# Altium footprint library ACTION_排针排座.PcbLib: 121 footprints (part 1 of 8)
Each footprint in its own frame and in the unit in brackets; x right, y up, seen from the top. Pads: shape width x height; smd on the part's side, far side on the other; paste and mask are expansions set on the pad; w line width, h text height; cw(c..) or ccw(c..) is an arc to the next point about the centre after c.
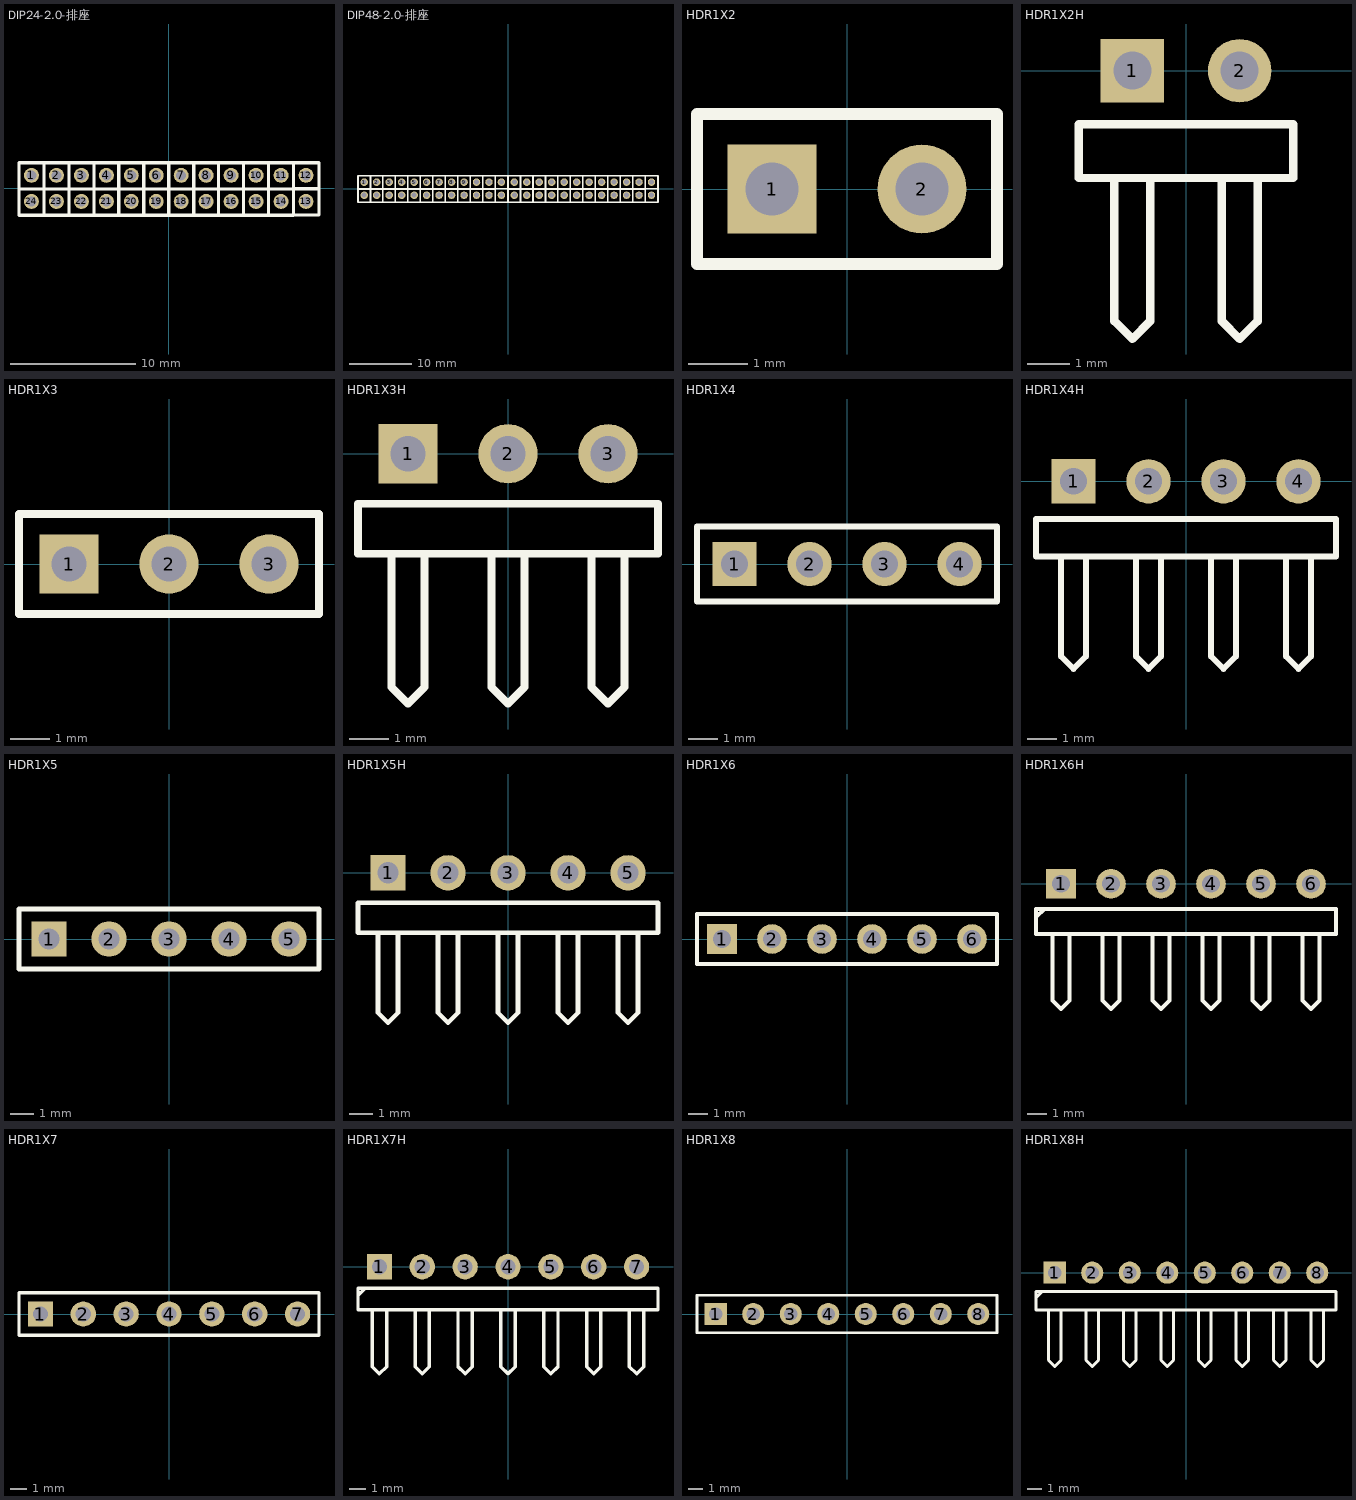
[diagram p0: the footprints below, top view; thin cyan lines are the x and y axes]

## DIP24-2.0-排座 [mm]
pads (24):
  round 1.2 hole 0.8: 1(-11,1.05) 2(-9,1.05) 3(-7,1.05) 4(-5,1.05) 5(-3,1.05) 6(-1,1.05) 7(1,1.05) 8(3,1.05) 9(5,1.05) 10(7,1.05) 11(9,1.05) 12(11,1.05) 13(11,-1.05) 14(9,-1.05) 15(7,-1.05) 16(5,-1.05) 17(3,-1.05) 18(1,-1.05) 19(-1,-1.05) 20(-3,-1.05) 21(-5,-1.05) 22(-7,-1.05) 23(-9,-1.05) 24(-11,-1.05)
Top Overlay:
  lines w0.254: -10.12,2.05 12.042,2.05 12.042,-2.142 9.96,-2.142 ; -10,-2.05 -10,-0.05 ; -10,0.05 -10,2.05 ; -8,-2.05 -8,-0.05 ; -8,0.05 -8,2.05 ; -6,-2.05 -6,-0.05 ; -6,0.05 -6,2.05 ; -4,-2.05 -4,-0.05 ; -4,0.05 -4,2.05 ; -2,-2.05 -2,-0.05 ; -2,0.05 -2,2.05 ; 0,-2.05 0,-0.05 ; 0,0.05 0,2.05 ; 2,-2.05 2,-0.05 ; 2,0.05 2,2.05 ; 4,-2.05 4,-0.05 ; 4,0.05 4,2.05 ; 6,-2.05 6,-0.05 ; 6,0.05 6,2.05 ; 8,-2.05 8,-0.05 ; 8,0.05 8,2.05 ; 9.985,-0.034 11.966,-0.034 ; 10,-2.15 -12,-2.15 -12,-0.05 ; 10,-2.05 10,-0.05 ; 10.007,0.05 10.007,2.05 -12,2.05 -12,-0.05 ; -12,-0.05 10,-0.05 ; -12,-0.05 10,-0.05

## DIP48-2.0-排座 [mm]
pads (48):
  round 1.2 hole 0.8: 1(-23.063,1.092) 2(-21.063,1.092) 3(-19.063,1.092) 4(-17.063,1.092) 5(-15.063,1.092) 6(-13.063,1.092) 7(-11.063,1.092) 8(-9.063,1.092) 9(-7.063,1.092) 10(-5.063,1.092) 11(-3.063,1.092) 12(-1.063,1.092) 13(0.991,1.092) 14(2.991,1.092) 15(4.991,1.092) 16(6.991,1.092) 17(8.991,1.092) 18(10.991,1.092) 19(12.991,1.092) 20(14.991,1.092) 21(16.991,1.092) 22(18.991,1.092) 23(20.991,1.092) 24(22.991,1.092) 25(22.991,-1.008) 26(20.991,-1.008) 27(18.991,-1.008) 28(16.991,-1.008) 29(14.991,-1.008) 30(12.991,-1.008) 31(10.991,-1.008) 32(8.991,-1.008) 33(6.991,-1.008) 34(4.991,-1.008) 35(2.991,-1.008) 36(0.991,-1.008) 37(-1.063,-1.008) 38(-3.063,-1.008) 39(-5.063,-1.008) 40(-7.063,-1.008) 41(-9.063,-1.008) 42(-11.063,-1.008) 43(-13.063,-1.008) 44(-15.063,-1.008) 45(-17.063,-1.008) 46(-19.063,-1.008) 47(-21.063,-1.008) 48(-23.063,-1.008)
Top Overlay:
  lines w0.254: -22.184,2.092 -0.021,2.092 -0.021,-2.1 -2.104,-2.1 ; -22.063,-2.008 -22.063,-0.008 ; -22.063,0.092 -22.063,2.092 ; -20.063,-2.008 -20.063,-0.008 ; -20.063,0.092 -20.063,2.092 ; -18.063,-2.008 -18.063,-0.008 ; -18.063,0.092 -18.063,2.092 ; -16.063,-2.008 -16.063,-0.008 ; -16.063,0.092 -16.063,2.092 ; -14.063,-2.008 -14.063,-0.008 ; -14.063,0.092 -14.063,2.092 ; -12.063,-2.008 -12.063,-0.008 ; -12.063,0.092 -12.063,2.092 ; -10.063,-2.008 -10.063,-0.008 ; -10.063,0.092 -10.063,2.092 ; -8.063,-2.008 -8.063,-0.008 ; -8.063,0.092 -8.063,2.092 ; -6.063,-2.008 -6.063,-0.008 ; -6.063,0.092 -6.063,2.092 ; -4.063,-2.008 -4.063,-0.008 ; -4.063,0.092 -4.063,2.092 ; -2.078,0.008 -0.097,0.008 ; -2.063,-2.108 -24.063,-2.108 -24.063,-0.008 ; -2.063,-2.008 -2.063,-0.008 ; -2.057,0.092 -2.057,2.092 -24.063,2.092 -24.063,-0.008 ; 1.87,2.092 24.033,2.092 24.033,-2.1 21.95,-2.1 ; 1.991,-2.008 1.991,-0.008 ; 1.991,0.092 1.991,2.092 ; 3.991,-2.008 3.991,-0.008 ; 3.991,0.092 3.991,2.092 ; 5.991,-2.008 5.991,-0.008 ; 5.991,0.092 5.991,2.092 ; 7.991,-2.008 7.991,-0.008 ; 7.991,0.092 7.991,2.092 ; 9.991,-2.008 9.991,-0.008 ; 9.991,0.092 9.991,2.092 ; 11.991,-2.008 11.991,-0.008 ; 11.991,0.092 11.991,2.092 ; 13.991,-2.008 13.991,-0.008 ; 13.991,0.092 13.991,2.092 ; 15.991,-2.008 15.991,-0.008 ; 15.991,0.092 15.991,2.092 ; 17.991,-2.008 17.991,-0.008 ; 17.991,0.092 17.991,2.092 ; 19.991,-2.008 19.991,-0.008 ; 19.991,0.092 19.991,2.092 ; 21.976,0.008 23.957,0.008 ; 21.991,-2.108 -0.009,-2.108 -0.009,-0.008 ; 21.991,-2.008 21.991,-0.008 ; 21.997,0.092 21.997,2.092 -0.009,2.092 -0.009,-0.008 ; -24.063,-0.008 -2.063,-0.008 ; -24.063,-0.008 -2.063,-0.008 ; -0.009,-0.008 21.991,-0.008 ; -0.009,-0.008 21.991,-0.008

## HDR1X2 [mm] "Connector; Header; 2 Position"
pads (2):
  rect 1.5x1.5 hole 0.9: 1(-1.27,0)
  round 1.5 hole 0.9: 2(1.27,0)
Top Overlay:
  lines w0.2: -2.54,-1.27 2.54,-1.27 2.54,1.27 -2.54,1.27 -2.54,-1.27
3D body "HEADER 2.STEP": height 10.1, standoff -1.5, extent -2.515,-1.295 2.565,1.245

## HDR1X2H [mm] "Connector; Header; 2 Position; Right Angle"
pads (2):
  rect 1.5x1.5 hole 0.9: 1(-1.27,0)
  round 1.5 hole 0.9: 2(1.27,0)
Top Overlay:
  lines w0.2: -1.693,-2.54 -1.693,-5.927 -1.27,-6.35 -0.847,-5.927 -0.847,-2.54 ; 0.847,-2.54 0.847,-5.927 1.27,-6.35 1.693,-5.927 1.693,-2.54 ; -2.54,-2.54 2.54,-2.54 2.54,-1.27 -2.54,-1.27 -2.54,-2.54
3D body "HEADER 2H.STEP": height 4.33, standoff -3, extent -2.565,-7.051 2.515,1.219

## HDR1X3 [mm] "Connector; Header; 3 Position"
pads (3):
  rect 1.5x1.5 hole 0.9: 1(-2.54,0)
  round 1.5 hole 0.9: 2(0,0) 3(2.54,0)
Top Overlay:
  lines w0.2: -3.81,-1.27 3.81,-1.27 3.81,1.27 -3.81,1.27 -3.81,-1.27
3D body "HEADER 3.STEP": height 10.1, standoff -1.5, extent -3.835,-1.245 3.785,1.295

## HDR1X3H [mm] "Connector; Header; 3 Position; Right Angle"
pads (3):
  rect 1.5x1.5 hole 0.9: 1(-2.54,0)
  round 1.5 hole 0.9: 2(0,0) 3(2.54,0)
Top Overlay:
  lines w0.2: -2.963,-2.54 -2.963,-5.927 -2.54,-6.35 -2.117,-5.927 -2.117,-2.54 ; -0.423,-2.54 -0.423,-5.927 0,-6.35 0.423,-5.927 0.423,-2.54 ; 2.117,-2.54 2.117,-5.927 2.54,-6.35 2.963,-5.927 2.963,-2.54 ; -3.81,-2.54 -3.81,-1.27 3.81,-1.27 3.81,-2.54 -3.81,-2.54
3D body "HEADER 3H.STEP": height 4.27, standoff -3.05, extent -3.835,-7.102 3.785,1.168

## HDR1X4 [mm] "Connector; Header; 4 Position"
pads (4):
  rect 1.5x1.5 hole 0.9: 1(-3.81,0)
  round 1.5 hole 0.9: 2(-1.27,0) 3(1.27,0) 4(3.81,0)
Top Overlay:
  lines w0.2: -5.08,-1.27 -5.08,1.27 5.08,1.27 5.08,-1.27 -5.08,-1.27
3D body "HEADER 4.STEP": height 10.1, standoff -1.5, extent -5.08,-1.219 5.08,1.321

## HDR1X4H [mm] "Connector; Header; 4 Position; Right Angle"
pads (4):
  rect 1.5x1.5 hole 0.9: 1(-3.81,0)
  round 1.5 hole 0.9: 2(-1.27,0) 3(1.27,0) 4(3.81,0)
Top Overlay:
  lines w0.2: -4.233,-2.54 -4.233,-5.927 -3.81,-6.35 -3.387,-5.927 -3.387,-2.54 ; -1.693,-2.54 -1.693,-5.927 -1.27,-6.35 -0.847,-5.927 -0.847,-2.54 ; 0.847,-2.54 0.847,-5.927 1.27,-6.35 1.693,-5.927 1.693,-2.54 ; 3.387,-2.54 3.387,-5.927 3.81,-6.35 4.233,-5.927 4.233,-2.54 ; -5.08,-2.54 5.08,-2.54 5.08,-1.27 -5.08,-1.27 -5.08,-2.54
3D body "HEADER 4H.STEP": height 4.33, standoff -3, extent -5.055,-7.025 5.105,1.245

## HDR1X5 [mm] "Connector; Header; 5 Position"
pads (5):
  rect 1.5x1.5 hole 0.9: 1(-5.08,0)
  round 1.5 hole 0.9: 2(-2.54,0) 3(0,0) 4(2.54,0) 5(5.08,0)
Top Overlay:
  lines w0.2: -6.35,-1.27 -6.35,1.27 6.35,1.27 6.35,-1.27 -6.35,-1.27
3D body "HEADER 5.STEP": height 10.1, standoff -1.5, extent -6.35,-1.27 6.35,1.27

## HDR1X5H [mm] "Connector; Header; 5 Position; Right Angle"
pads (5):
  rect 1.5x1.5 hole 0.9: 1(-5.08,0)
  round 1.5 hole 0.9: 2(-2.54,0) 3(0,0) 4(2.54,0) 5(5.08,0)
Top Overlay:
  lines w0.2: -5.503,-2.54 -5.503,-5.927 -5.08,-6.35 -4.657,-5.927 -4.657,-2.54 ; -2.963,-2.54 -2.963,-5.927 -2.54,-6.35 -2.117,-5.927 -2.117,-2.54 ; -0.423,-2.54 -0.423,-5.927 0,-6.35 0.423,-5.927 0.423,-2.54 ; 2.117,-2.54 2.117,-5.927 2.54,-6.35 2.963,-5.927 2.963,-2.54 ; 4.657,-2.54 4.657,-5.927 5.08,-6.35 5.503,-5.927 5.503,-2.54 ; -6.35,-2.54 6.35,-2.54 6.35,-1.27 -6.35,-1.27 -6.35,-2.54
3D body "HEADER 5H.STEP": height 4.33, standoff -3, extent -6.401,-6.975 6.299,1.295

## HDR1X6 [mm] "Connector; Header; 6 Position"
pads (6):
  rect 1.5x1.5 hole 0.9: 1(-6.35,0)
  round 1.5 hole 0.9: 2(-3.81,0) 3(-1.27,0) 4(1.27,0) 5(3.81,0) 6(6.35,0)
Top Overlay:
  lines w0.2: -7.62,-1.27 7.62,-1.27 7.62,1.27 -7.62,1.27 -7.62,-1.27
3D body "HEADER 6.STEP": height 10.1, standoff -1.5, extent -7.569,-1.27 7.671,1.27

## HDR1X6H [mm] "Connector; Header; 6 Position; Right Angle"
pads (6):
  rect 1.5x1.5 hole 0.9: 1(-6.35,0)
  round 1.5 hole 0.9: 2(-3.81,0) 3(-1.27,0) 4(1.27,0) 5(3.81,0) 6(6.35,0)
Top Overlay:
  lines w0.2: -7.62,-1.693 -7.197,-1.27 ; -6.773,-2.54 -6.773,-5.927 -6.35,-6.35 -5.927,-5.927 -5.927,-2.54 ; -4.233,-2.54 -4.233,-5.927 -3.81,-6.35 -3.387,-5.927 -3.387,-2.54 ; -1.693,-2.54 -1.693,-5.927 -1.27,-6.35 -0.847,-5.927 -0.847,-2.54 ; 0.847,-2.54 0.847,-5.927 1.27,-6.35 1.693,-5.927 1.693,-2.54 ; 3.387,-2.54 3.387,-5.927 3.81,-6.35 4.233,-5.927 4.233,-2.54 ; 5.927,-2.54 5.927,-5.927 6.35,-6.35 6.773,-5.927 6.773,-2.54 ; -7.62,-2.54 -7.62,-1.27 7.62,-1.27 7.62,-2.54 -7.62,-2.54
3D body "HEADER 6H.STEP": height 4.33, standoff -3, extent -7.62,-7 7.62,1.27

## HDR1X7 [mm] "Connector; Header; 7 Position"
pads (7):
  rect 1.5x1.5 hole 0.9: 1(-7.62,0)
  round 1.5 hole 0.9: 2(-5.08,0) 3(-2.54,0) 4(0,0) 5(2.54,0) 6(5.08,0) 7(7.62,0)
Top Overlay:
  lines w0.2: -8.89,-1.27 -8.89,1.27 8.89,1.27 8.89,-1.27 -8.89,-1.27
3D body "HEADER 7.STEP": height 10.1, standoff -1.5, extent -8.865,-1.245 8.915,1.295

## HDR1X7H [mm] "Connector; Header; 7 Position; Right Angle"
pads (7):
  rect 1.5x1.5 hole 0.9: 1(-7.62,0)
  round 1.5 hole 0.9: 2(-5.08,0) 3(-2.54,0) 4(0,0) 5(2.54,0) 6(5.08,0) 7(7.62,0)
Top Overlay:
  lines w0.2: -8.89,-1.693 -8.467,-1.27 ; -8.043,-2.54 -8.043,-5.927 -7.62,-6.35 -7.197,-5.927 -7.197,-2.54 ; -5.503,-2.54 -5.503,-5.927 -5.08,-6.35 -4.657,-5.927 -4.657,-2.54 ; -2.963,-2.54 -2.963,-5.927 -2.54,-6.35 -2.117,-5.927 -2.117,-2.54 ; -0.423,-2.54 -0.423,-5.927 0,-6.35 0.423,-5.927 0.423,-2.54 ; 2.117,-2.54 2.117,-5.927 2.54,-6.35 2.963,-5.927 2.963,-2.54 ; 4.657,-2.54 4.657,-5.927 5.08,-6.35 5.503,-5.927 5.503,-2.54 ; 7.197,-2.54 7.197,-5.927 7.62,-6.35 8.043,-5.927 8.043,-2.54 ; -8.89,-2.54 -8.89,-1.27 8.89,-1.27 8.89,-2.54 -8.89,-2.54
3D body "HEADER 7H.STEP": height 4.33, standoff -3, extent -8.89,-6.949 8.89,1.321

## HDR1X8 [mm] "Connector; Header; 8 Position"
pads (8):
  rect 1.5x1.5 hole 0.9: 1(-8.89,0)
  round 1.5 hole 0.9: 2(-6.35,0) 3(-3.81,0) 4(-1.27,0) 5(1.27,0) 6(3.81,0) 7(6.35,0) 8(8.89,0)
Top Overlay:
  lines w0.2: -10.16,-1.27 -10.16,1.27 10.16,1.27 10.16,-1.27 -10.16,-1.27
3D body "HEADER 8.STEP": height 10.1, standoff -1.5, extent -10.16,-1.295 10.16,1.245

## HDR1X8H [mm] "Connector; Header; 8 Position; Right Angle"
pads (8):
  rect 1.5x1.5 hole 0.9: 1(-8.89,0)
  round 1.5 hole 0.9: 2(-6.35,0) 3(-3.81,0) 4(-1.27,0) 5(1.27,0) 6(3.81,0) 7(6.35,0) 8(8.89,0)
Top Overlay:
  lines w0.2: -10.16,-1.693 -9.737,-1.27 ; -9.313,-2.54 -9.313,-5.927 -8.89,-6.35 -8.467,-5.927 -8.467,-2.54 ; -6.773,-2.54 -6.773,-5.927 -6.35,-6.35 -5.927,-5.927 -5.927,-2.54 ; -4.233,-2.54 -4.233,-5.927 -3.81,-6.35 -3.387,-5.927 -3.387,-2.54 ; -1.693,-2.54 -1.693,-5.927 -1.27,-6.35 -0.847,-5.927 -0.847,-2.54 ; 0.847,-2.54 0.847,-5.927 1.27,-6.35 1.693,-5.927 1.693,-2.54 ; 3.387,-2.54 3.387,-5.927 3.81,-6.35 4.233,-5.927 4.233,-2.54 ; 5.927,-2.54 5.927,-5.927 6.35,-6.35 6.773,-5.927 6.773,-2.54 ; 8.467,-2.54 8.467,-5.927 8.89,-6.35 9.313,-5.927 9.313,-2.54 ; -10.16,-2.54 10.16,-2.54 10.16,-1.27 -10.16,-1.27 -10.16,-2.54
3D body "HEADER 8H.STEP": height 4.33, standoff -3, extent -10.084,-6.975 10.236,1.295